# Altium footprint library Gesturelink PCB Library.PcbLib: 57 footprints (part 1 of 4)
Each footprint in its own frame and in the unit in brackets; x right, y up, seen from the top. Pads: shape width x height; smd on the part's side, far side on the other; paste and mask are expansions set on the pad; w line width, h text height; cw(c..) or ccw(c..) is an arc to the next point about the centre after c.
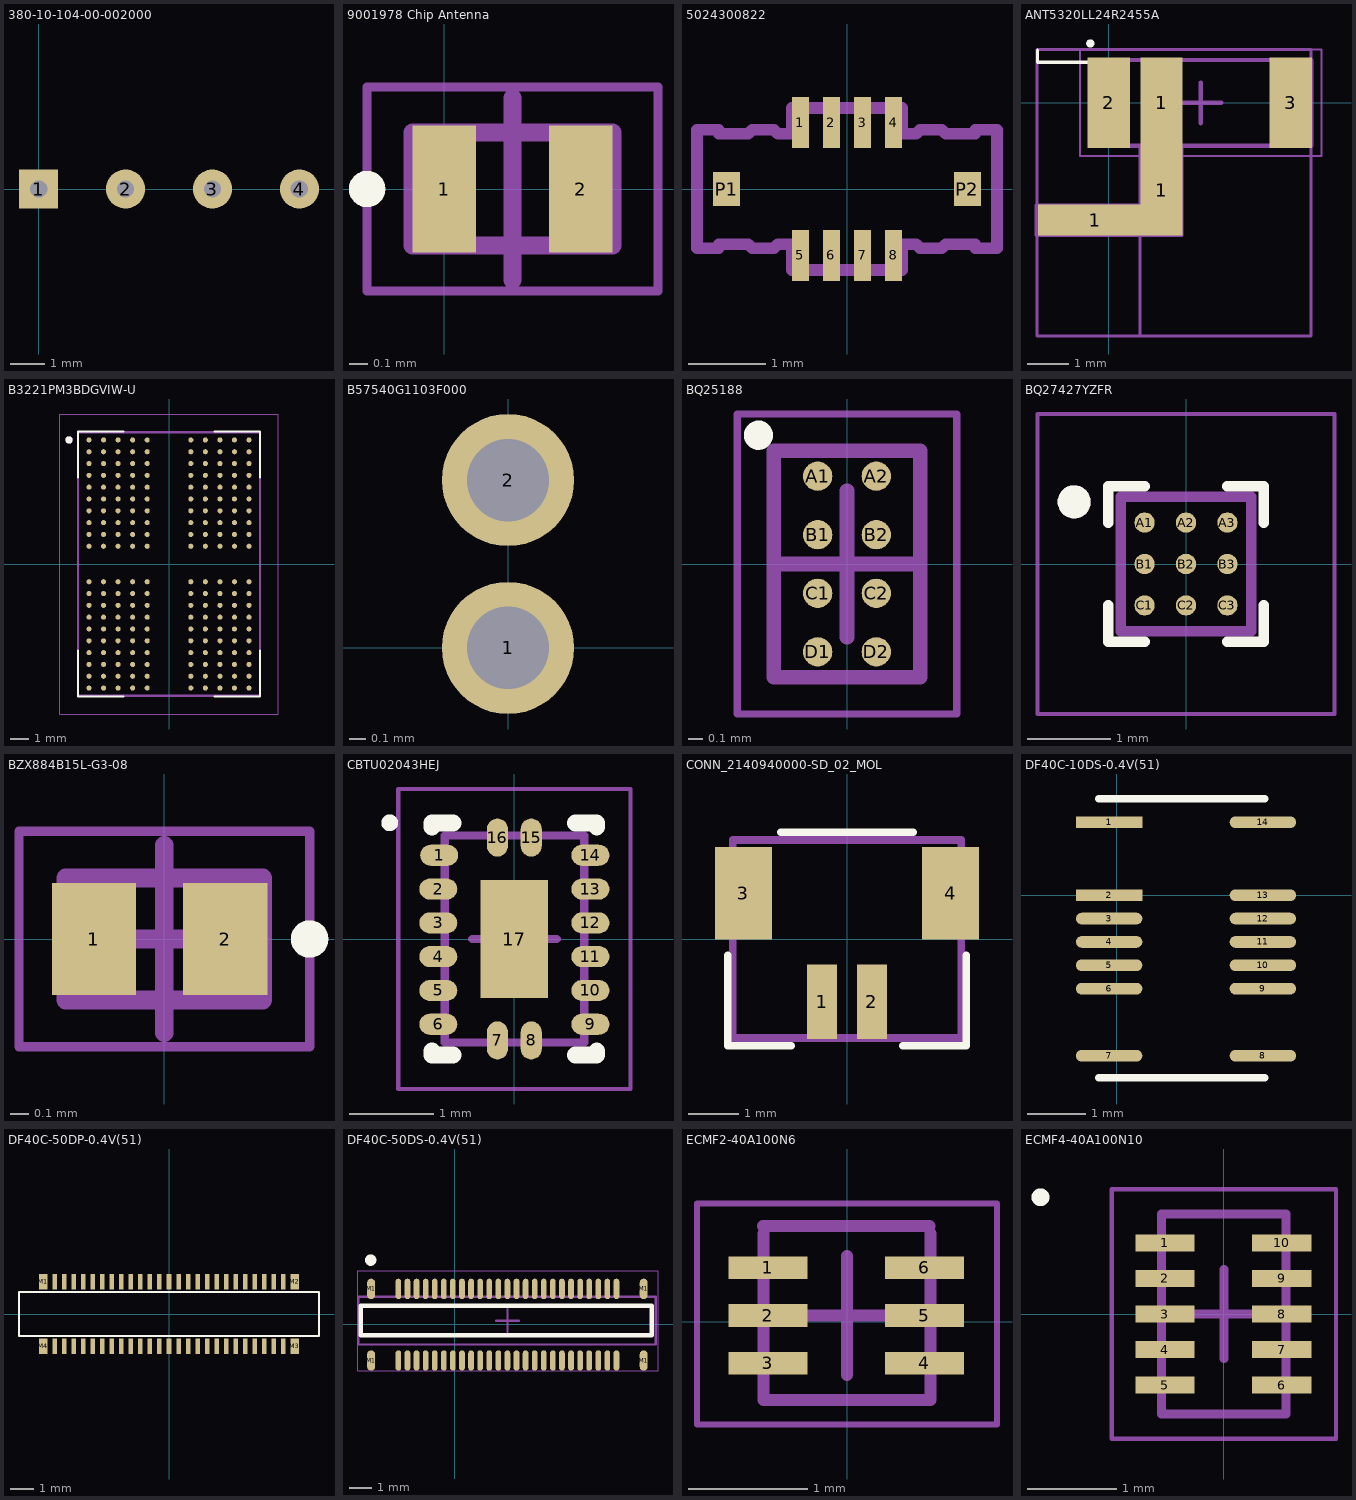
[diagram p0: the footprints below, top view; thin cyan lines are the x and y axes]

## 380-10-104-00-002000 [mil]
pads (4):
  rect 45x45 hole 20: 1(0,0)
  round 45 hole 20: 2(100,0) 3(200,0) 4(300,0)
3D body "solder cup thru hole PCB mount.SLDPRT.STEP": height 186.89, standoff -118.11, extent -50,-50 350,50

## 9001978 Chip Antenna [mm] "DFN, 2-Leads, Body 0.55x1.00mm, Pitch 0.65mm, IPC Medium Density"
height 0.4
pads (2):
  rect 0.35x0.7 smd: 1(0,0) 2(0.75,0)
Top Overlay:
  circle w0.1: c-0.425,0 r0.05
Mechanical 13:
  lines w0.1: -0.175,-0.31 -0.175,0.31 0.925,0.31 0.925,-0.31 -0.175,-0.31
Mechanical 15:
  lines w0.05: -0.425,-0.56 1.175,-0.56 1.175,0.56 -0.425,0.56 -0.425,-0.56
  lines w0.1: 0.375,-0.5 0.375,0.5
3D body: height 0.4, standoff 0.02, extent -0.175,-0.31 0.925,0.31

## 5024300822 [mm]
pads (10):
  rect 0.22x0.66 smd: 1(-0.6,0.855) 2(-0.2,0.855) 3(0.2,0.855) 4(0.6,0.855) 5(-0.6,-0.855) 6(-0.2,-0.855) 7(0.2,-0.855) 8(0.6,-0.855)
  rect 0.35x0.44 smd: P1(-1.55,0) P2(1.55,0)
Mechanical 13:
  lines w0.152: -1.93,-0.762 -1.651,-0.762 -1.651,-0.711 -1.27,-0.711 -1.219,-0.762 -0.94,-0.762 -0.889,-0.711 -0.711,-0.711 -0.711,-1.041 0.711,-1.041 0.711,-0.711 0.889,-0.711 0.94,-0.762 1.219,-0.762 1.27,-0.711 1.651,-0.711 1.651,-0.762 1.93,-0.762 1.93,0.762 1.651,0.762 1.651,0.711 1.27,0.711 1.219,0.762 0.94,0.762 0.889,0.711 0.711,0.711 0.711,1.041 -0.711,1.041 -0.711,0.711 -0.889,0.711 -0.94,0.762 -1.219,0.762 -1.27,0.711 -1.651,0.711 -1.651,0.762 -1.93,0.762 -1.93,-0.762
3D body "5024300822.stp": height 0.78, standoff -0.02, extent -1.93,-1.04 1.93,1.04

## ANT5320LL24R2455A [mm]
height 1.25
pads (5):
  rect 2.794x0.75 smd: 1(-0.33,-2.866)
  rect 1.03x2.21 smd: 1(1.29,-2.136) 1(1.29,0) 2(0,0) 3(4.45,0)
Top Overlay:
  circle w0.1: c-0.45,1.45 r0.05
  lines w0.076: -1.743,0.992 -1.743,1.292 ; -1.738,0.991 -0.508,0.991
Mechanical 1:
  lines w0.076: 0.762,-5.69 0.762,-3.25 ; -1.753,-5.7 4.947,-5.7 4.947,1.3 -1.753,1.3 -1.753,-5.7
Mechanical 4:
  lines w0.076: 0.765,-3.244 -1.778,-3.244 -1.778,-2.494 0.765,-2.494 0.765,-3.244 ; 0.765,-3.244 1.795,-3.244 1.795,-1.092 0.765,-1.092 0.765,-3.244
Mechanical 13:
  lines w0.1: -0.45,-1.05 4.95,-1.05 4.95,1.05 -0.45,1.05 -0.45,-1.05
Mechanical 15:
  lines w0.05: -0.7,-1.3 5.2,-1.3 5.2,1.3 -0.7,1.3 -0.7,-1.3
  lines w0.1: 1.75,0 2.75,0 ; 2.25,-0.5 2.25,0.5
Multi-Layer:
  pour cut-out: -1.753,1.321 4.953,1.321 4.953,-5.715 -1.753,-5.715 -1.753,1.295
3D body: height 1.25, standoff 0.05, extent -0.45,-1.05 4.95,1.05

## B3221PM3BDGVIW-U [mm]
height 0.95
pads (200):
  round 0.28 smd: A1(-4.4,6.825) A2(-3.6,6.825) A3(-2.8,6.825) A4(-2,6.825) A5(-1.2,6.825) A8(1.2,6.825) A9(2,6.825) A10(2.8,6.825) A11(3.6,6.825) A12(4.4,6.825) AA1(-4.4,-6.175) AA2(-3.6,-6.175) AA3(-2.8,-6.175) AA4(-2,-6.175) AA5(-1.2,-6.175) AA8(1.2,-6.175) AA9(2,-6.175) AA10(2.8,-6.175) AA11(3.6,-6.175) AA12(4.4,-6.175) AB1(-4.4,-6.825) AB2(-3.6,-6.825) AB3(-2.8,-6.825) AB4(-2,-6.825) AB5(-1.2,-6.825) AB8(1.2,-6.825) AB9(2,-6.825) AB10(2.8,-6.825) AB11(3.6,-6.825) AB12(4.4,-6.825) B1(-4.4,6.175) B2(-3.6,6.175) B3(-2.8,6.175) B4(-2,6.175) B5(-1.2,6.175) B8(1.2,6.175) B9(2,6.175) B10(2.8,6.175) B11(3.6,6.175) B12(4.4,6.175) C1(-4.4,5.525) C2(-3.6,5.525) C3(-2.8,5.525) C4(-2,5.525) C5(-1.2,5.525) C8(1.2,5.525) C9(2,5.525) C10(2.8,5.525) C11(3.6,5.525) C12(4.4,5.525) D1(-4.4,4.875) D2(-3.6,4.875) D3(-2.8,4.875) D4(-2,4.875) D5(-1.2,4.875) D8(1.2,4.875) D9(2,4.875) D10(2.8,4.875) D11(3.6,4.875) D12(4.4,4.875) E1(-4.4,4.225) E2(-3.6,4.225) E3(-2.8,4.225) E4(-2,4.225) E5(-1.2,4.225) E8(1.2,4.225) E9(2,4.225) E10(2.8,4.225) E11(3.6,4.225) E12(4.4,4.225) F1(-4.4,3.575) F2(-3.6,3.575) F3(-2.8,3.575) F4(-2,3.575) F5(-1.2,3.575) F8(1.2,3.575) F9(2,3.575) F10(2.8,3.575) F11(3.6,3.575) F12(4.4,3.575) G1(-4.4,2.925) G2(-3.6,2.925) G3(-2.8,2.925) G4(-2,2.925) G5(-1.2,2.925) G8(1.2,2.925) G9(2,2.925) G10(2.8,2.925) G11(3.6,2.925) G12(4.4,2.925) H1(-4.4,2.275) H2(-3.6,2.275) H3(-2.8,2.275) H4(-2,2.275) H5(-1.2,2.275) H8(1.2,2.275) H9(2,2.275) H10(2.8,2.275) H11(3.6,2.275) H12(4.4,2.275) J1(-4.4,1.625) J2(-3.6,1.625) J3(-2.8,1.625) J4(-2,1.625) J5(-1.2,1.625) J8(1.2,1.625) J9(2,1.625) J10(2.8,1.625) J11(3.6,1.625) J12(4.4,1.625) K1(-4.4,0.975) K2(-3.6,0.975) K3(-2.8,0.975) K4(-2,0.975) K5(-1.2,0.975) K8(1.2,0.975) K9(2,0.975) K10(2.8,0.975) K11(3.6,0.975) K12(4.4,0.975) N1(-4.4,-0.975) N2(-3.6,-0.975) N3(-2.8,-0.975) N4(-2,-0.975) N5(-1.2,-0.975) N8(1.2,-0.975) N9(2,-0.975) N10(2.8,-0.975) N11(3.6,-0.975) N12(4.4,-0.975) P1(-4.4,-1.625) P2(-3.6,-1.625) P3(-2.8,-1.625) P4(-2,-1.625) P5(-1.2,-1.625) P8(1.2,-1.625) P9(2,-1.625) P10(2.8,-1.625) P11(3.6,-1.625) P12(4.4,-1.625) R1(-4.4,-2.275) R2(-3.6,-2.275) R3(-2.8,-2.275) R4(-2,-2.275) R5(-1.2,-2.275) R8(1.2,-2.275) R9(2,-2.275) R10(2.8,-2.275) R11(3.6,-2.275) R12(4.4,-2.275) T1(-4.4,-2.925) T2(-3.6,-2.925) T3(-2.8,-2.925) T4(-2,-2.925) T5(-1.2,-2.925) T8(1.2,-2.925) T9(2,-2.925) T10(2.8,-2.925) T11(3.6,-2.925) T12(4.4,-2.925) U1(-4.4,-3.575) U2(-3.6,-3.575) U3(-2.8,-3.575) U4(-2,-3.575) U5(-1.2,-3.575) U8(1.2,-3.575) U9(2,-3.575) U10(2.8,-3.575) U11(3.6,-3.575) U12(4.4,-3.575) V1(-4.4,-4.225) V2(-3.6,-4.225) V3(-2.8,-4.225) V4(-2,-4.225) V5(-1.2,-4.225) V8(1.2,-4.225) V9(2,-4.225) V10(2.8,-4.225) V11(3.6,-4.225) V12(4.4,-4.225) W1(-4.4,-4.875) W2(-3.6,-4.875) W3(-2.8,-4.875) W4(-2,-4.875) W5(-1.2,-4.875) W8(1.2,-4.875) W9(2,-4.875) W10(2.8,-4.875) W11(3.6,-4.875) W12(4.4,-4.875) Y1(-4.4,-5.525) Y2(-3.6,-5.525) Y3(-2.8,-5.525) Y4(-2,-5.525) Y5(-1.2,-5.525) Y8(1.2,-5.525) Y9(2,-5.525) Y10(2.8,-5.525) Y11(3.6,-5.525) Y12(4.4,-5.525)
Top Overlay:
  circle w0.2: c-5.5,6.825 r0.1
  lines w0.127: -5,-4.77 -5,-7.285 -2.5,-7.285 ; -5,4.77 -5,7.285 -2.5,7.285 ; 2.5,-7.285 5,-7.285 5,-4.77 ; 2.5,7.285 5,7.285 5,4.77
Mechanical 13:
  circle w0.2: c-5.5,6.825 r0.1
  lines w0.127: -5,-7.25 5,-7.25 5,7.25 -5,7.25 -5,-7.25
Mechanical 15:
  lines w0.05: -6,-8.25 6,-8.25 6,8.25 -6,8.25 -6,-8.25
3D body "step_temp.STEP": height 0.95, standoff 0, extent -5,-7.25 5,7.25

## B57540G1103F000 [mm]
pads (2):
  round 0.8 hole 0.499: 1(0,0) 2(0,1.016)

## BQ25188 [mm]
height 0.5
pads (8):
  round 0.2 smd: A1(-0.2,0.6) A2(0.2,0.6) B1(-0.2,0.2) B2(0.2,0.2) C1(-0.2,-0.2) C2(0.2,-0.2) D1(-0.2,-0.6) D2(0.2,-0.6)
Top Overlay:
  circle w0.1: c-0.605,0.88 r0.05
Mechanical 13:
  lines w0.1: -0.5,-0.775 -0.5,0.775 0.5,0.775 0.5,-0.775 -0.5,-0.775
Mechanical 15:
  lines w0.05: -0.75,-1.025 -0.75,1.025 0.75,1.025 0.75,-1.025 -0.75,-1.025
  lines w0.1: -0.5,0 0.5,0 ; 0,-0.5 0,0.5
3D body: height 0.5, standoff 0.2, extent -0.5,-0.775 0.5,0.775

## BQ27427YZFR [mm]
height 0.625
pads (9):
  round 0.245 smd paste-1 mask+0.05: A1(-0.5,0.5) A2(0,0.5) A3(0.5,0.5) B1(-0.5,0) B2(0,0) B3(0.5,0) C1(-0.5,-0.5) C2(0,-0.5) C3(0.5,-0.5)
Top Overlay:
  circle w0.2: c-1.35,0.75 r0.1
  lines w0.127: -0.938,-0.5 -0.938,-0.938 -0.5,-0.938 ; -0.938,0.5 -0.938,0.938 -0.5,0.938 ; 0.5,-0.938 0.938,-0.938 0.938,-0.5 ; 0.5,0.938 0.938,0.938 0.938,0.5
Top Paste:
  drawing of 9 lines, arcs and shapes, not listed
Mechanical 13:
  circle w0.2: c-1.35,0.75 r0.1
  lines w0.127: -0.79,-0.81 0.79,-0.81 0.79,0.81 -0.79,0.81 -0.79,-0.81
Mechanical 15:
  lines w0.05: -1.79,-1.81 1.79,-1.81 1.79,1.81 -1.79,1.81 -1.79,-1.81
3D body "step_temp.STEP": height 0.63, standoff 0, extent -0.81,-0.79 0.81,0.79

## BZX884B15L-G3-08 [mm] "DFN, 2-Leads, Body 0.60x1.00mm, Pitch 0.70mm, IPC Medium Density"
height 0.5
pads (2):
  rect 0.45x0.6 smd: 1(-0.375,0) 2(0.325,0)
Top Overlay:
  circle w0.1: c0.775,0 r0.05
Mechanical 13:
  lines w0.1: -0.525,-0.325 0.525,-0.325 0.525,0.325 -0.525,0.325 -0.525,-0.325
Mechanical 15:
  lines w0.05: -0.775,-0.575 0.775,-0.575 0.775,0.575 -0.775,0.575 -0.775,-0.575
  lines w0.1: -0.5,0 0.5,0 ; 0,-0.5 0,0.5
3D body: height 0.5, standoff 0.05, extent -0.525,-0.325 0.525,0.325

## CBTU02043HEJ [mm]
height 0.55
pads (17):
  oval 0.45x0.25 smd: 1(-0.889,0.991) 2(-0.9,0.591) 3(-0.9,0.191) 4(-0.9,-0.209) 5(-0.9,-0.609) 6(-0.9,-1.009) 9(0.9,-1.009) 10(0.9,-0.609) 11(0.9,-0.209) 12(0.9,0.191) 13(0.9,0.591) 14(0.9,0.991)
  oval 0.25x0.45 smd: 7(-0.2,-1.2) 8(0.2,-1.2) 15(0.2,1.2) 16(-0.2,1.2)
  rect 0.8x1.4 smd: 17(0,0)
Top Overlay:
  circle w0.1: c-1.475,1.375 r0.05
  lines w0.2: -0.975,-1.325 -0.975,-1.375 -0.725,-1.375 ; -0.975,1.325 -0.975,1.375 -0.725,1.375 ; 0.725,-1.375 0.975,-1.375 0.975,-1.325 ; 0.725,1.375 0.975,1.375 0.975,1.325
Mechanical 13:
  lines w0.1: -0.825,-1.225 -0.825,1.225 0.825,1.225 0.825,-1.225 -0.825,-1.225
Mechanical 15:
  lines w0.05: -1.375,-1.775 -1.375,1.775 1.375,1.775 1.375,-1.775 -1.375,-1.775
  lines w0.1: -0.5,0 0.5,0 ; 0,-0.5 0,0.5
3D body: height 0.55, standoff 0.03, extent -0.825,-1.225 0.825,1.225

## CONN_2140940000-SD_02_MOL [mil]
pads (4):
  rect 24x59 smd: 1(-19.68,-49.45) 2(19.68,-49.45)
  rect 45x73 smd: 3(-81.69,36.18) 4(81.69,36.18)
Top Overlay:
  lines w6: -94,-13 -94,-84 -44,-84 ; -52,84 52,84 ; 44,-84 94,-84 94,-13
Mechanical 13:
  lines w6: -90,-78 90,-78 90,78 -90,78 -90,-78
3D body "2140940020.stp": height 192.91, standoff -19.69, extent -83.74,-73.74 95,83.74

## DF40C-10DS-0.4V(51) [mm]
pads (14):
  rect 1.14x0.2 smd: 1(-0.127,1.25) 2(-0.127,0)
  oval 1.14x0.2 smd: 3(-0.127,-0.4) 4(-0.127,-0.8) 5(-0.127,-1.2) 6(-0.127,-1.6) 7(-0.127,-2.75) 8(2.507,-2.75) 9(2.507,-1.6) 10(2.507,-1.2) 11(2.507,-0.8) 12(2.507,-0.4) 13(2.507,0) 14(2.507,1.25)
Top Overlay:
  lines w0.127: -0.305,-3.124 2.54,-3.124 ; -0.305,1.651 2.54,1.651
3D body "DF40B-10DS.stp": height 1.4, standoff -0.05, extent -0.547,-3.058 2.833,1.542

## DF40C-50DP-0.4V(51) [mm]
pads (54):
  rect 0.19x0.66 smd: 1(-4.8,1.355) 2(-4.4,1.355) 3(-4,1.355) 4(-3.6,1.355) 5(-3.2,1.355) 6(-2.8,1.355) 7(-2.4,1.355) 8(-2,1.355) 9(-1.6,1.355) 10(-1.2,1.355) 11(-0.8,1.355) 12(-0.4,1.355) 13(0,1.355) 14(0.4,1.355) 15(0.8,1.355) 16(1.2,1.355) 17(1.6,1.355) 18(2,1.355) 19(2.4,1.355) 20(2.8,1.355) 21(3.2,1.355) 22(3.6,1.355) 23(4,1.355) 24(4.4,1.355) 25(4.8,1.355) 26(4.8,-1.355) 27(4.4,-1.355) 28(4,-1.355) 29(3.6,-1.355) 30(3.2,-1.355) 31(2.8,-1.355) 32(2.4,-1.355) 33(2,-1.355) 34(1.6,-1.355) 35(1.2,-1.355) 36(0.8,-1.355) 37(0.4,-1.355) 38(0,-1.355) 39(-0.4,-1.355) 40(-0.8,-1.355) 41(-1.2,-1.355) 42(-1.6,-1.355) 43(-2,-1.355) 44(-2.4,-1.355) 45(-2.8,-1.355) 46(-3.2,-1.355) 47(-3.6,-1.355) 48(-4,-1.355) 49(-4.4,-1.355) 50(-4.8,-1.355)
  rect 0.35x0.66 smd: M1(-5.28,1.355) M2(5.28,1.355) M3(5.28,-1.355) M4(-5.28,-1.355)
Top Overlay:
  lines w0.1: -6.3,-0.925 -6.3,0.925 6.3,0.925 6.3,-0.925 -6.3,-0.925
3D body "DF40C-50DP-0.4V-51---3DModel-STEP-269445.STEP": height 1.14, standoff 0, extent -5.76,-1.485 5.76,1.485

## DF40C-50DS-0.4V(51) [mm] "50 Position Connector Receptacle, Center Strip Contacts Surface Mount Gold"
height 1.29
pads (54):
  oval 0.25x0.9 smd: 1(-2.489,-1.602) 2(-2.089,-1.602) 3(-1.689,-1.602) 4(-1.289,-1.602) 5(-0.889,-1.602) 6(-0.489,-1.602) 7(-0.089,-1.602) 8(0.311,-1.602) 9(0.711,-1.602) 10(1.111,-1.602) 11(1.511,-1.602) 12(1.911,-1.602) 13(2.311,-1.602) 14(2.711,-1.602) 15(3.111,-1.602) 16(3.511,-1.602) 17(3.911,-1.602) 18(4.311,-1.602) 19(4.711,-1.602) 20(5.111,-1.602) 21(5.511,-1.602) 22(5.911,-1.602) 23(6.311,-1.602) 24(6.711,-1.602) 25(7.111,-1.602) 26(7.111,1.55) 27(6.711,1.551) 28(6.311,1.551) 29(5.911,1.551) 30(5.511,1.551) 31(5.111,1.551) 32(4.711,1.551) 33(4.311,1.551) 34(3.911,1.551) 35(3.511,1.551) 36(3.111,1.551) 37(2.711,1.551) 38(2.311,1.551) 39(1.911,1.551) 40(1.511,1.551) 41(1.111,1.551) 42(0.711,1.551) 43(0.311,1.551) 44(-0.089,1.551) 45(-0.489,1.551) 46(-0.889,1.551) 47(-1.289,1.551) 48(-1.689,1.551) 49(-2.089,1.551) 50(-2.489,1.55)
  oval 0.35x0.9 smd: M1(-3.689,-1.602) M1(-3.689,1.55) M1(8.311,-1.602) M1(8.311,1.55)
Top Overlay:
  circle w0.25: c-3.708,2.819 r0.125
  lines w0.2: -4.14,-0.498 -4.14,0.802 8.661,0.802 8.661,-0.498 -4.14,-0.498
Mechanical 13:
  lines w0.1: -4.242,-0.898 -4.242,1.202 8.839,1.202 8.839,-0.898 -4.242,-0.898
Mechanical 15:
  lines w0.05: -4.267,-2.048 -4.267,2.352 8.941,2.352 8.941,-2.048 -4.267,-2.048
  lines w0.1: 1.811,0.152 2.811,0.152 ; 2.311,-0.348 2.311,0.652
3D body "DF40C-50DS-0.4V(51)--3DModel-STEP-269445.STEP": height 1.5, standoff 0.05, extent -4.013,-1.715 8.587,1.665

## ECMF2-40A100N6 [mm]
pads (6):
  rect 0.664x0.19 smd: 1(-0.664,0.451) 2(-0.664,0.051) 3(-0.664,-0.349) 4(0.65,-0.349) 5(0.65,0.051) 6(0.65,0.451)
Mechanical 13:
  lines w0.1: -0.705,0.802 0.695,0.802 ; -0.7,0.74 -0.7,-0.66 0.7,-0.66 0.7,0.74
Mechanical 15:
  lines w0.05: -1.26,-0.864 -1.26,0.991 1.26,0.991 1.26,-0.864 -1.26,-0.864
  lines w0.1: -0.5,0.051 0.5,0.051 ; 0,-0.449 0,0.551
3D body: height 0.25, standoff 0, extent -0.7,-0.711 0.7,0.838

## ECMF4-40A100N10 [mm] "SON, 10-Leads, Body 2.20x1.35mm, Pitch 0.40mm, Thermal Pad 0.00x0.00mm, IPC Medium Density"
height 0.5
pads (10):
  rect 0.664x0.19 smd: 1(-0.664,0.8) 2(-0.664,0.4) 3(-0.664,0) 4(-0.664,-0.4) 5(-0.664,-0.8) 6(0.65,-0.8) 7(0.65,-0.4) 8(0.65,0) 9(0.65,0.4) 10(0.65,0.8)
Top Overlay:
  circle w0.1: c-2.062,1.312 r0.05
Mechanical 13:
  lines w0.1: -0.7,-1.125 0.7,-1.125 0.7,1.125 -0.7,1.125 -0.7,-1.125
Mechanical 15:
  lines w0.05: -1.26,-1.4 1.26,-1.4 1.26,1.4 -1.26,1.4 -1.26,-1.4
  lines w0.1: -0.5,0 0.5,0 ; 0,-0.5 0,0.5
3D body: height 0.5, standoff 0.02, extent -0.7,-1.125 0.7,1.125